# Altium footprint library 19-Resistors.PcbLib: 199 footprints (part 3 of 13)
Each footprint in its own frame and in the unit in brackets; x right, y up, seen from the top. Pads: shape width x height; smd on the part's side, far side on the other; paste and mask are expansions set on the pad; w line width, h text height; cw(c..) or ccw(c..) is an arc to the next point about the centre after c.
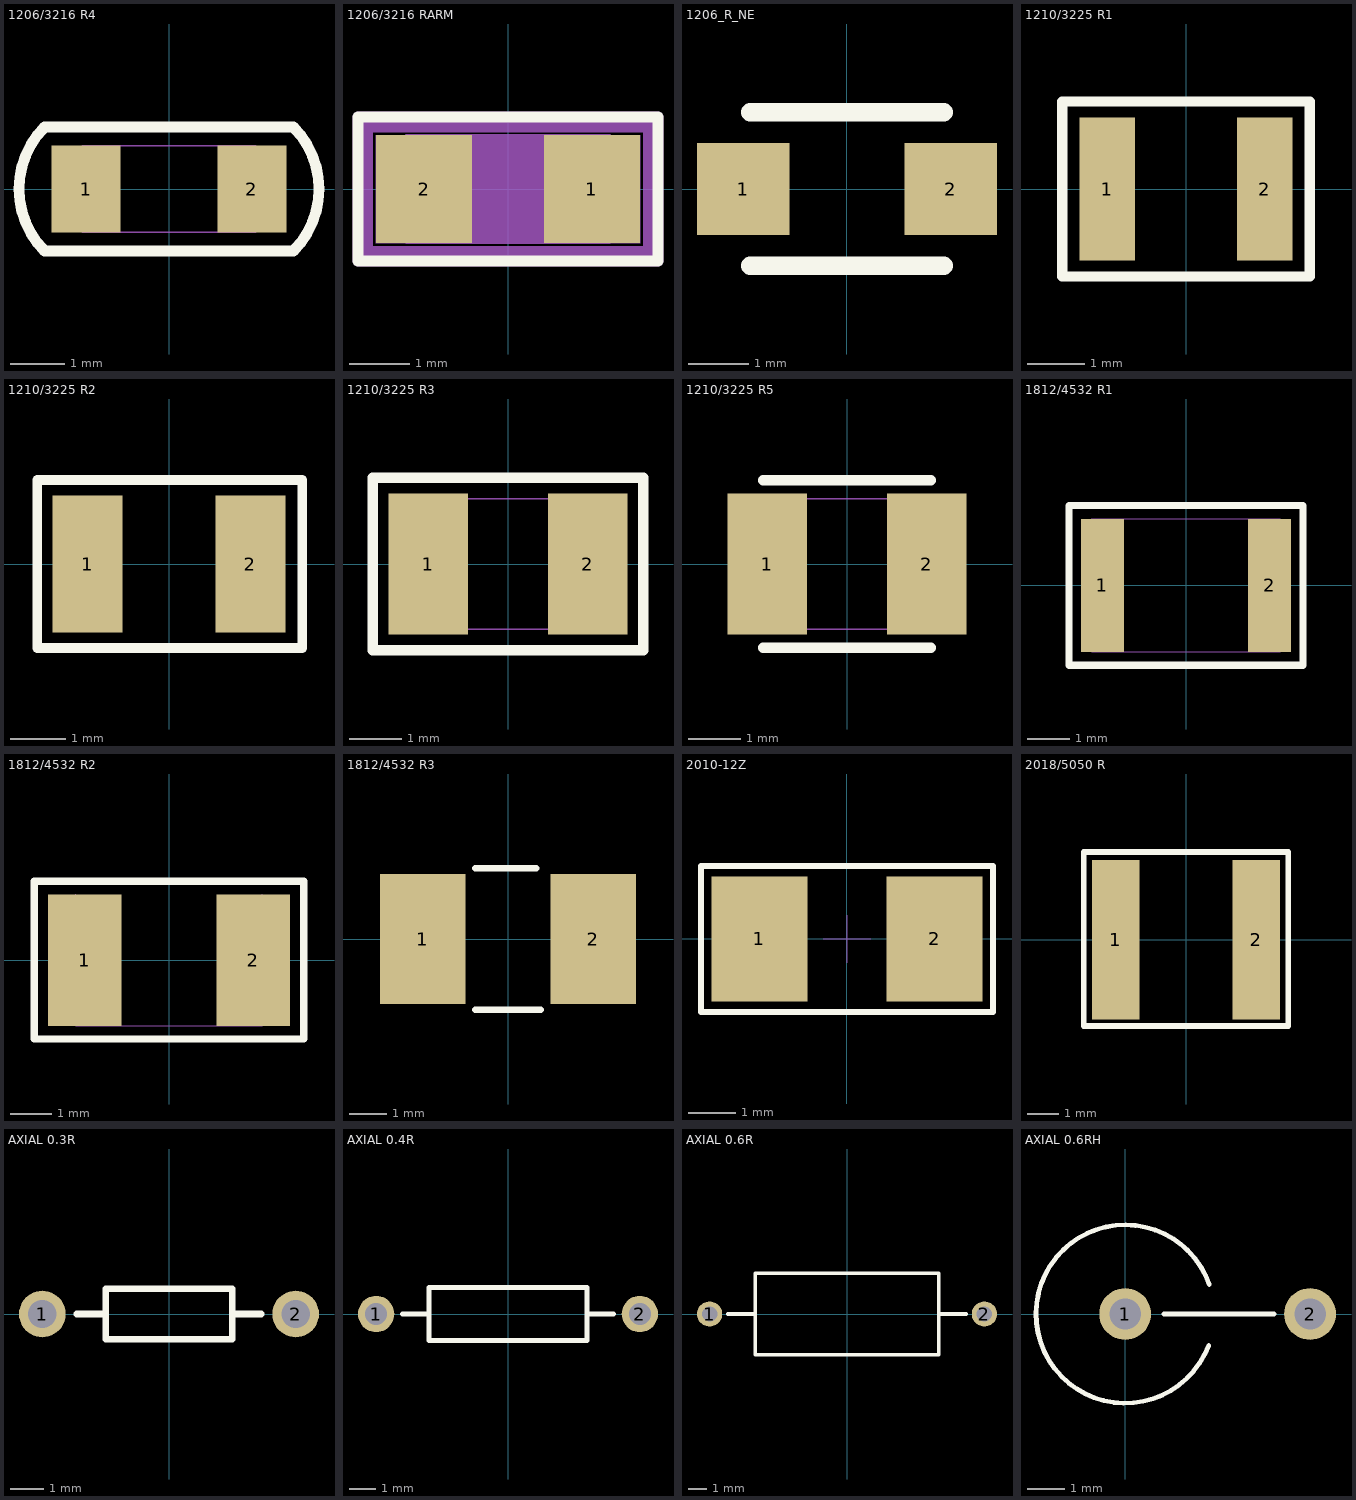
[diagram p2: the footprints below, top view; thin cyan lines are the x and y axes]

## 1206/3216 R4 [mil]
height 649.61
pads (2):
  rect 50x63 smd mask+2.76: 1(-60,0)
  rect 50x63 smd: 2(60,0)
Top Overlay:
  lines w7.87: -90,-45 cw(c-45,0) -90,45 90,45 cw(c45,0) 90,-45 -90,-45
Mechanical 15:
  lines w1: -63,-31.5 -63,31.5 63,31.5 63,-31.5 -63,-31.5
3D body "1206-r.stp": height 21.85, standoff 0, extent -63,-32 62.98,30.99
3D body "1_6-1_27-1206a.stp": height 0.79, standoff 0, extent -85,-31.49 -35,31.5
3D body "1_6-1_27-1206a.stp": height 0.79, standoff 0, extent 35,-31.49 85,31.5

## 1206/3216 RARM [mm]
height 16.5
pads (2):
  rect 1.6x1.8 smd: 1(1.4,0) 2(-1.4,0)
Top Overlay:
  lines w0.18: 2.472,-1.2 -2.5,-1.2 -2.5,1.2 2.5,1.2 2.5,-1.2
Mechanical 7:
  lines w0.18: 2.472,-1.2 -2.5,-1.2 -2.5,1.2 2.5,1.2 2.5,-1.2
Mechanical 16:
  pour cut-out: 0,-0.408 -0.156,-0.377 -0.288,-0.288 -0.377,-0.156 -0.408,0 -0.377,0.156 -0.288,0.288 -0.156,0.377 0,0.408 0.156,0.377 0.288,0.288 0.377,0.156 0.408,0 0.377,-0.156 0.288,-0.288 0.156,-0.377
  region: -2.4,0 -2.25,0 -2.25,0.95 2.25,0.95 2.25,0 2.4,0 2.4,1.1 -2.4,1.1
  region: 2.4,0 2.25,0 2.25,-0.95 -2.25,-0.95 -2.25,0 -2.4,0 -2.4,-1.1 2.4,-1.1
  region: 2.2,-0.9 -2.2,-0.9 -2.2,0.9 2.2,0.9
  lines w0.025: -2.5,-1 -2.5,1 2.5,1 2.5,-1 -2.5,-1 ; -1.7,-0.9 1.7,-0.9 1.7,0.9 -1.7,0.9 -1.7,-0.9
Mechanical 18:
  text "1" at 1.4,0.2 h0.5
  text "2" at -1.4,0.2 h0.5
3D body "1206-r.stp": height 0.56, standoff 0, extent -1.6,-0.8 1.6,0.8
3D body "1206-arm.stp": height 0, standoff 0, extent 0.6,-0.9 2.2,0.9
3D body "1206-arm.stp": height 0, standoff 0, extent -2.2,-0.9 -0.6,0.9

## 1206_R_NE [mil]
height 649.61
pads (2):
  rect 60x60 smd: 1(-67.5,0)
  rect 60x60 smd mask+2.76: 2(67.5,0)
Top Overlay:
  lines w12: -62.99,-50 62.99,-50 ; -62.99,50 62.99,50
3D body "1_524-1_524.stp": height 0.79, standoff 0, extent 37.51,-29.99 97.51,30.01
3D body "1_524-1_524.stp": height 0.79, standoff 0, extent -97.49,-29.99 -37.49,30.01
3D body "1206-r.stp": height 21.85, standoff 0, extent -62.99,-31.5 62.99,31.5

## 1210/3225 R1 [mil]
height 649.61
pads (2):
  rect 38x98 smd mask+2.76: 1(-54,0)
  rect 38x98 smd: 2(54,0)
Top Overlay:
  lines w7: -85,-60 -85,60 85,60 85,-60 -85,-60
3D body "1210-r.stp": height 22.05, standoff 0, extent -63,-49 62.98,49.43
3D body "0_965-2_489-1210.stp": height 0.79, standoff 0, extent -73.49,-48.99 -35.5,49
3D body "0_965-2_489-1210.stp": height 0.79, standoff 0, extent 35.01,-48.99 73,49

## 1210/3225 R2 [mil]
height 649.61
pads (2):
  rect 50x98 smd mask+2.76: 1(-58,0)
  rect 50x98 smd: 2(58,0)
Top Overlay:
  lines w7: -94,-60 95,-60 95,60 -94,60 -94,-60
3D body "1_27-2_489-1210a.stp": height 0.79, standoff 0, extent 33,-48.99 83,49
3D body "1_27-2_489-1210a.stp": height 0.79, standoff 0, extent -83,-48.99 -33,49
3D body "1210-r.stp": height 22.05, standoff 0, extent -63,-49 62.98,49.43

## 1210/3225 R3 [mil]
height 649.61
pads (2):
  rect 60x106 smd mask+2.76: 1(-60,0)
  rect 60x106 smd: 2(60,0)
Top Overlay:
  lines w7.87: -102,-65 -102,65 102,65 102,-65 -102,-65
Mechanical 15:
  lines w1: -63,-49 63,-49 63,49 -63,49 -63,-49
3D body "1210-r.stp": height 22.05, standoff 0, extent -63,-49 62.98,49.43
3D body "1_524-2_692-1210c.stp": height 0.79, standoff 0, extent -90,-52.99 -30,53
3D body "1_524-2_692-1210c.stp": height 0.79, standoff 0, extent 30.01,-52.98 90.01,53

## 1210/3225 R5 [mil]
height 649.61
pads (2):
  rect 60x106 smd: 1(-60,0)
  rect 60x106 smd mask+2.76: 2(60,0)
Top Overlay:
  lines w7.87: -62.99,-62.99 62.99,-62.99 ; -62.99,62.99 62.99,62.99
Mechanical 15:
  lines w1: -63,-49 -63,49 63,49 63,-49 -63,-49
3D body "1_524-2_692-1210c.stp": height 0.79, standoff 0, extent -90,-52.99 -30,52.99
3D body "1_524-2_692-1210c.stp": height 0.79, standoff 0, extent 30,-52.99 90,53
3D body "1210-r.stp": height 22.05, standoff 0, extent -63,-49 62.98,49.43

## 1812/4532 R1 [mil]
height 649.61
pads (2):
  rect 40x125 smd: 1(-78.5,0)
  rect 40x125 smd mask+2.76: 2(78.5,0)
Top Overlay:
  lines w7: -110,-75 -110,75 110,75 110,-75 -110,-75
Mechanical 16:
  lines w1: -88.5,-62.5 88.5,-62.5 88.5,62.5 -88.5,62.5 -88.5,-62.5
3D body "3_175-1_016-1812.stp": height 0.79, standoff 0, extent 59,-62.5 99,62.5
3D body "3_175-1_016-1812.stp": height 0.79, standoff 0, extent -99,-62.5 -59,62.5
3D body "1812_smt-r.stp": height 22.05, standoff 0, extent -88.58,-63 88.58,62.98

## 1812/4532 R2 [mil]
height 649.61
pads (2):
  rect 70x125 smd mask+2.76: 1(-80,0)
  rect 70x125 smd: 2(80,0)
Top Overlay:
  lines w7: -128,-75 -128,75 128,75 128,-75 -128,-75
Mechanical 16:
  lines w1: -88.5,62.5 -88.5,-62.5 88.5,-62.5 88.5,62.5
3D body "3_175-1_778-1812.stp": height 0.79, standoff 0, extent 44.5,-62.5 114.5,62.5
3D body "3_175-1_778-1812.stp": height 0.79, standoff 0, extent -114.49,-62.5 -44.5,62.5
3D body "1812_smt-r.stp": height 22.05, standoff 0, extent -88.58,-63 88.58,62.98

## 1812/4532 R3 [mm] "PPTC"
height 16.5
pads (2):
  rect 2.3x3.5 smd mask+0.07: 1(-2.3,0)
  rect 2.3x3.5 smd: 2(2.3,0)
Top Overlay:
  lines w0.178: -0.889,-1.905 0.889,-1.905 ; -0.889,1.905 0.762,1.905
3D body "3_5-2_3-1812.stp": height 0.02, standoff 0, extent 1.149,-1.737 3.449,1.763
3D body "3_5-2_3-1812.stp": height 0.02, standoff 0, extent -3.461,-1.75 -1.161,1.75
3D body "1812_smt-r.stp": height 0.56, standoff 0, extent -2.25,-1.6 2.25,1.6

## 2010-12Z [mm]
height 16.5
pads (2):
  rect 2x2.6 smd: 1(-1.829,0) 2(1.829,0)
Top Overlay:
  lines w0.127: -3.048,-1.524 3.048,-1.524 3.048,1.524 -3.048,1.524 -3.048,-1.524
Mechanical 15:
  lines w0.01: -0.5,0 0.5,0 ; 0,-0.5 0,0.5
  lines w0.1: -3.048,-1.524 -3.048,1.524 3.048,1.524 3.048,-1.524 -3.048,-1.524
3D body "2010r.stp": height 0.69, standoff 0, extent -2.54,-1.27 2.54,1.27
3D body "2_6-1_2.stp": height 0.01, standoff 0, extent -2.8,-1.3 -1.6,1.3
3D body "2_6-1_2.stp": height 0.01, standoff 0, extent 1.6,-1.3 2.8,1.3

## 2018/5050 R [mil]
height 649.61
pads (2):
  rect 60x200 smd mask+2.76: 1(-88,0)
  rect 60x200 smd: 2(88,0)
Top Overlay:
  lines w7: -128,-108 128,-108 128,110 -128,110 -128,-108
3D body "p508-150.stp": height 0.79, standoff 0, extent -117.53,-100 -58.47,100
3D body "p508-150.stp": height 0.79, standoff 0, extent 58.47,-100 117.53,100
3D body "2018-5050r.stp": height 33.07, standoff 0, extent -98,-98 98.85,98.85

## AXIAL 0.3R [mm] "Res 1/8w,7.62mmX3.2mmX1.5mm"
height 16.5
pads (2):
  round 1.4 hole 0.85 mask+0.07: 1(-3.81,0)
  round 1.4 hole 0.85: 2(3.81,0)
Top Overlay:
  lines w0.2: -2.769,0 -1.905,0 ; 2.769,0 1.905,0 ; 1.905,0 1.905,0.762 -1.905,0.762 -1.905,-0.762 1.905,-0.762 1.905,0
3D body "1_5-1_5-0_7.stp": height 0.05, standoff -1.05, extent 3.06,-0.75 4.56,0.75
3D body "1_5-1_5-0_7.stp": height 1.1, standoff 0, extent -4.56,-0.75 -3.06,0.75
3D body "res_m1-8w.stp": height 1.5, standoff -2.5, extent -4.01,-0.762 4.01,0.738

## AXIAL 0.4R [mm] "Axial Device, Thru-Hole; 2 Leads; 0.4 in Pin Spacing"
height 2.032
pads (2):
  round 1.4 hole 0.85: 1(-5.08,0)
  round 1.4 hole 0.85 mask+0.07: 2(5.08,0)
Top Overlay:
  lines w0.2: -4.064,0 -3.048,0 ; 3.048,0 4.064,0 ; -3.048,-1.016 3.048,-1.016 3.048,1.016 -3.048,1.016 -3.048,-1.016
3D body "res_1_4w.stp": height 2.5, standoff -2.5, extent -5.35,-1.27 5.35,1.23
3D body "1_5-1_5-0_7.stp": height 0.05, standoff -1.05, extent -5.83,-0.75 -4.33,0.75
3D body "1_5-1_5-0_7.stp": height 0.05, standoff -1.05, extent 4.33,-0.75 5.83,0.75

## AXIAL 0.6R [mm] "Axial Device, Thru-Hole; 2 Leads; 0.6 in Pin Spacing"
height 2.54
pads (2):
  round 1.4 hole 0.85: 1(-7.62,0)
  round 1.4 hole 0.85 mask+0.07: 2(7.62,0)
Top Overlay:
  lines w0.2: -6.604,0 -5.08,0 ; 5.08,0 6.604,0 ; -5.08,-2.25 -5.08,2.25 5.08,2.25 5.08,-2.25 -5.08,-2.25
3D body "1_5-1_5-0_7.stp": height 0.05, standoff -1.05, extent 6.87,-0.75 8.37,0.75
3D body "1_5-1_5-0_7.stp": height 0.05, standoff -1.05, extent -8.37,-0.75 -6.87,0.75
3D body "res_m1w.stp": height 4, standoff -2.5, extent -7.9,-2.032 7.9,1.968

## AXIAL 0.6RH [mm]
height 2.54
pads (2):
  round 1.4 hole 0.85: 1(0,0)
  round 1.4 hole 0.85 mask+0.07: 2(5,0)
Top Overlay:
  lines w0.127: 1.041,0 4.026,0 ; 2.257,-0.849 cw(c0,0) 2.275,0.798
3D body "1_5-1_5-0_7.stp": height 0.05, standoff -1.05, extent 4.25,-0.75 5.75,0.75
3D body "1_5-1_5-0_7.stp": height 0.05, standoff -1.05, extent -0.75,-0.75 0.75,0.75